# Altium footprint library SparkFun.PCBLIB: 674 footprints (part 16 of 44)
Each footprint in its own frame and in the unit in brackets; x right, y up, seen from the top. Pads: shape width x height; smd on the part's side, far side on the other; paste and mask are expansions set on the pad; w line width, h text height; cw(c..) or ccw(c..) is an arc to the next point about the centre after c.
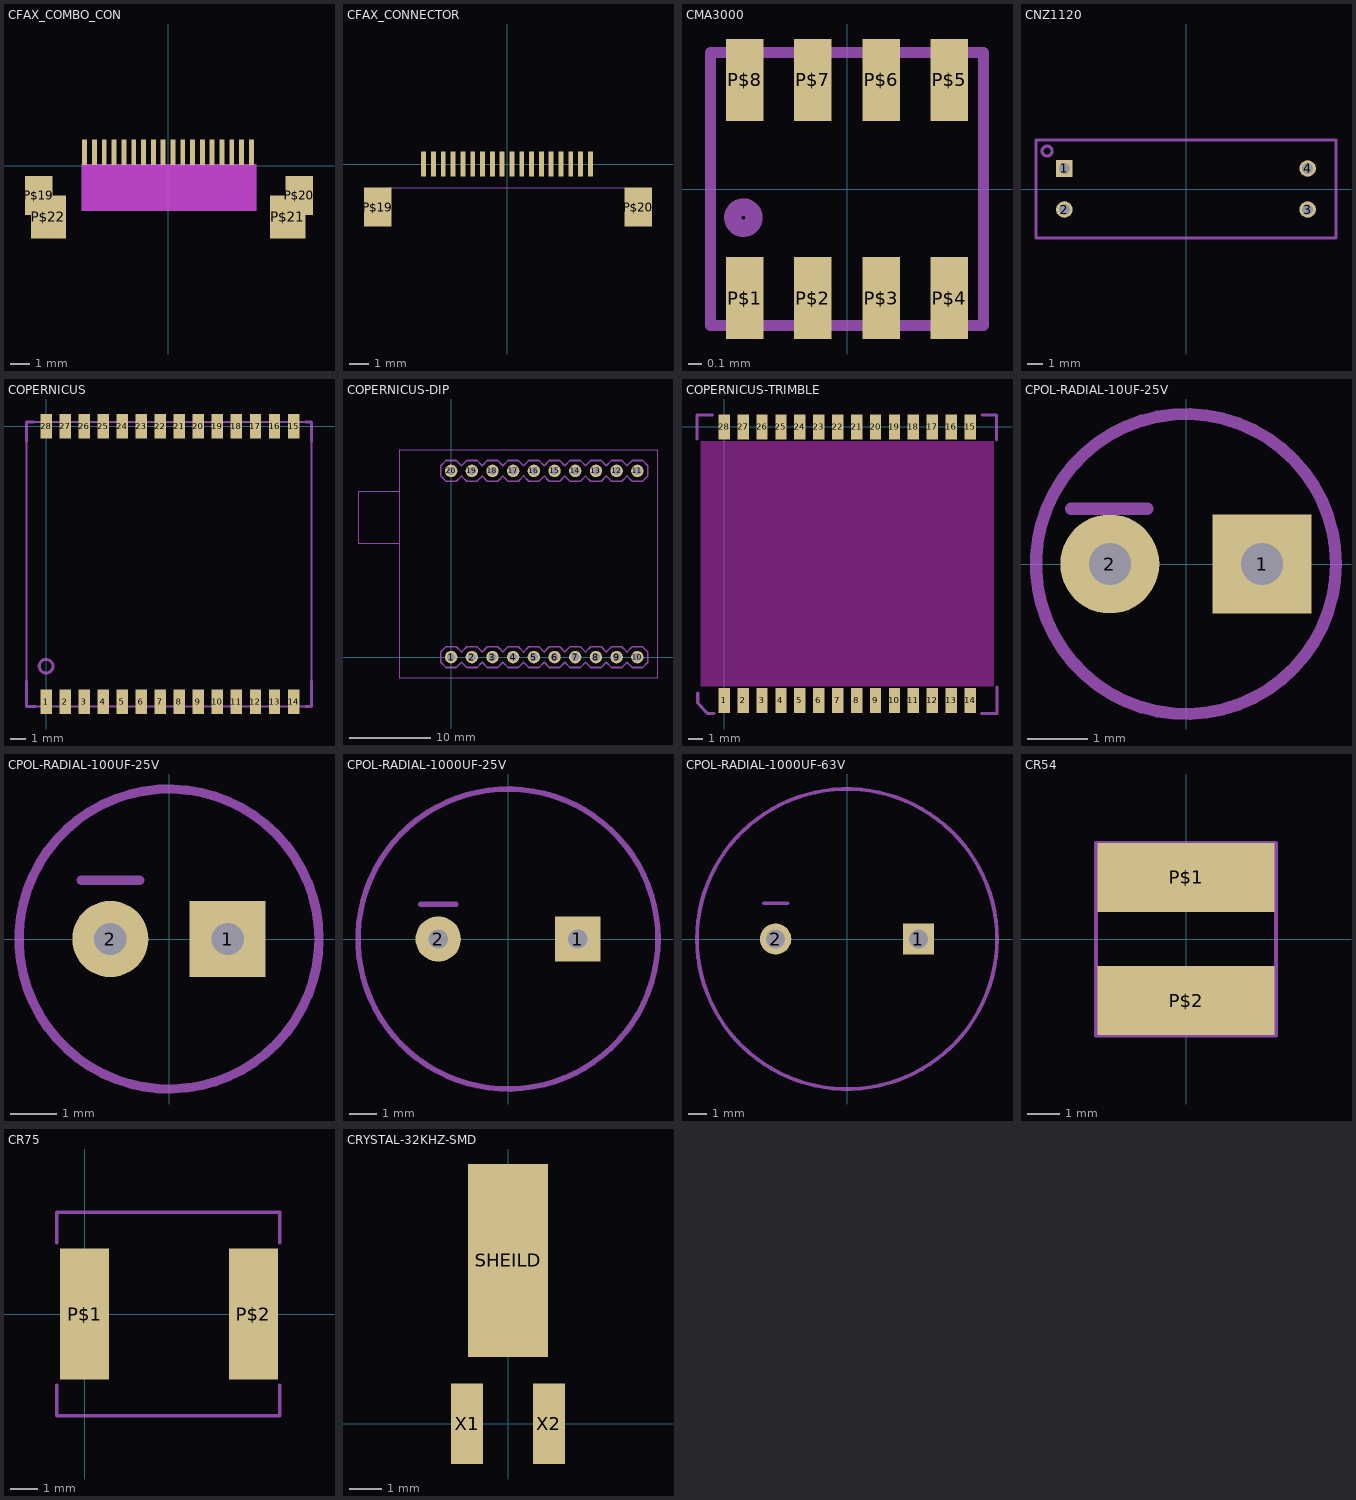
[diagram p15: the footprints below, top view; thin cyan lines are the x and y axes]

## CFAX_COMBO_CON [mm]
pads (22):
  rect 0.25x1.3 smd: P$1(-4.25,0.7) P$2(-3.75,0.7) P$3(-3.25,0.7) P$4(-2.75,0.7) P$5(-2.25,0.7) P$6(-1.75,0.7) P$7(-1.25,0.7) P$8(-0.75,0.7) P$9(-0.25,0.7) P$10(0.25,0.7) P$11(0.75,0.7) P$12(1.25,0.7) P$13(1.75,0.7) P$14(2.25,0.7) P$15(2.75,0.7) P$16(3.25,0.7) P$17(3.75,0.7) P$18(4.25,0.7)
  rect 1.4x2 smd: P$19(-6.6,-1.5) P$20(6.7,-1.5)
  rect 1.8x2.2 smd: P$21(6.1,-2.6) P$22(-6.1,-2.6)
Mechanical 10 keep-out:
  rectangle: -4.4,-2.3 4.5,0.1

## CFAX_CONNECTOR [mm]
pads (20):
  rect 0.25x1.3 smd: P$1(-4.25,0) P$2(-3.75,0) P$3(-3.25,0) P$4(-2.75,0) P$5(-2.25,0) P$6(-1.75,0) P$7(-1.25,0) P$8(-0.75,0) P$9(-0.25,0) P$10(0.25,0) P$11(0.75,0) P$12(1.25,0) P$13(1.75,0) P$14(2.25,0) P$15(2.75,0) P$16(3.25,0) P$17(3.75,0) P$18(4.25,0)
  rect 1.4x2 smd: P$19(-6.6,-2.2) P$20(6.7,-2.2)
Mechanical 2:
  lines w0: -6,-1.2 6,-1.2

## CMA3000 [mil]
pads (8):
  rect 10.83x23.62 smd: P$1(-29.53,-31.5) P$2(-9.84,-31.5) P$3(9.84,-31.5) P$4(29.53,-31.5) P$5(29.53,31.5) P$6(9.84,31.5) P$7(-9.84,31.5) P$8(-29.53,31.5)
Mechanical 2:
  circle w5: c-29.92,-8.27 r3.07
  lines w3.15: -39.37,-39.37 -39.37,39.37 ; 39.37,-39.37 39.37,39.37
Mechanical 18:
  lines w3.15: -39.37,-39.37 39.37,-39.37 ; -39.37,39.37 39.37,39.37

## CMA3000-A01 [mil]

## CNZ1120 [mm]
pads (4):
  rect 1.05x1.05 hole 0.7: 1(-7.7,1.3)
  round 1.05 hole 0.7: 2(-7.7,-1.3) 3(7.7,-1.3) 4(7.7,1.3)
Mechanical 2:
  circle w0.203: c-8.8,2.4 r0.316
  lines w0.203: -9.5,-3.1 9.5,-3.1 9.5,3.1 -9.5,3.1 -9.5,-3.1

## COPERNICUS [mil]
pads (28):
  rect 30x65 smd paste-32.5: 1(0,-723) 2(50,-723) 3(100,-723) 4(150,-723) 5(200,-723) 6(250,-723) 7(300,-723) 8(350,-723) 9(400,-723) 10(450,-723) 11(500,-723) 12(550,-723) 13(600,-723) 14(650,-723) 15(650,0) 16(600,0) 17(550,0) 18(500,0) 19(450,0) 20(400,0) 21(350,0) 22(300,0) 23(250,0) 24(200,0) 25(150,0) 26(100,0) 27(50,0) 28(0,0)
Top Paste:
  region: 0,0 10,0 10,10 0,10
  region: 0,0 10,0 10,10 0,10
  region: 0,0 10,0 10,10 0,10
  region: 0,0 10,0 10,10 0,10
  region: 0,0 10,0 10,10 0,10
  region: 0,0 10,0 10,10 0,10
  region: 0,0 10,0 10,10 0,10
  region: 0,0 10,0 10,10 0,10
  region: 0,0 10,0 10,10 0,10
  region: 0,0 10,0 10,10 0,10
  region: 0,0 10,0 10,10 0,10
  region: 0,0 10,0 10,10 0,10
  region: 0,0 10,0 10,10 0,10
  region: 0,0 10,0 10,10 0,10
  region: 0,0 10,0 10,10 0,10
  region: 0,0 10,0 10,10 0,10
  region: 0,0 10,0 10,10 0,10
  region: 0,0 10,0 10,10 0,10
  region: 0,0 10,0 10,10 0,10
  region: 0,0 10,0 10,10 0,10
  region: 0,0 10,0 10,10 0,10
  region: 0,0 10,0 10,10 0,10
  region: 0,0 10,0 10,10 0,10
  region: 0,0 10,0 10,10 0,10
  region: 0,0 10,0 10,10 0,10
  region: 0,0 10,0 10,10 0,10
  region: 0,0 10,0 10,10 0,10
  region: 0,0 10,0 10,10 0,10
Mechanical 2:
  circle w8: c0,-629.92 r17.99
  lines w8: -51.18,-669.29 -51.18,-736.22 -27.56,-736.22 ; -51.18,-39.37 -51.18,11.81 -31.5,11.81 ; 681.1,-736.22 696.85,-736.22 696.85,-669.29 ; 681.1,11.81 696.85,11.81 696.85,-39.37
Mechanical 18:
  lines w5: -51.18,-736.22 -51.18,11.81 696.85,11.81 696.85,-736.22 -51.18,-736.22

## COPERNICUS-DIP [mil]
pads (20):
  round 60 hole 40: 1(0,0) 2(100,0) 3(200,0) 4(300,0) 5(400,0) 6(500,0) 7(600,0) 8(700,0) 9(800,0) 10(900,0) 11(900,900) 12(800,900) 13(700,900) 14(600,900) 15(500,900) 16(400,900) 17(300,900) 18(200,900) 19(100,900) 20(0,900)
Mechanical 2:
  lines w8: -50,-25 -50,25 -25,50 25,50 50,25 75,50 125,50 150,25 175,50 225,50 250,25 275,50 325,50 350,25 375,50 425,50 450,25 475,50 525,50 550,25 575,50 625,50 650,25 675,50 725,50 750,25 775,50 825,50 850,25 875,50 925,50 950,25 950,-25 925,-50 875,-50 850,-25 825,-50 775,-50 750,-25 725,-50 675,-50 650,-25 625,-50 575,-50 550,-25 525,-50 475,-50 450,-25 425,-50 375,-50 350,-25 325,-50 275,-50 250,-25 225,-50 175,-50 150,-25 125,-50 75,-50 50,-25 25,-50 -25,-50 -50,-25 ; -50,875 -50,925 -25,950 25,950 50,925 75,950 125,950 150,925 175,950 225,950 250,925 275,950 325,950 350,925 375,950 425,950 450,925 475,950 525,950 550,925 575,950 625,950 650,925 675,950 725,950 750,925 775,950 825,950 850,925 875,950 925,950 950,925 950,875 925,850 875,850 850,875 825,850 775,850 750,875 725,850 675,850 650,875 625,850 575,850 550,875 525,850 475,850 450,875 425,850 375,850 350,875 325,850 275,850 250,875 225,850 175,850 150,875 125,850 75,850 50,875 25,850 -25,850 -50,875
Mechanical 18:
  rectangle: 590,-10 610,10
  rectangle: 490,-10 510,10
  rectangle: 390,-10 410,10
  rectangle: 290,-10 310,10
  rectangle: 190,-10 210,10
  rectangle: 90,-10 110,10
  rectangle: -10,-10 10,10
  rectangle: 890,-10 910,10
  rectangle: 790,-10 810,10
  rectangle: 690,-10 710,10
  rectangle: 590,890 610,910
  rectangle: 490,890 510,910
  rectangle: 390,890 410,910
  rectangle: 290,890 310,910
  rectangle: 190,890 210,910
  rectangle: 90,890 110,910
  rectangle: -10,890 10,910
  rectangle: 890,890 910,910
  rectangle: 790,890 810,910
  rectangle: 690,890 710,910
  lines w5: -250,550 -250,800 ; -250,550 -250,-100 1000,-100 1000,1000 -250,1000 -250,800 ; -250,550 -450,550 -450,800 -250,800

## COPERNICUS-TRIMBLE [mil]
pads (28):
  rect 30x65 smd paste-32.5: 1(0,-723) 2(50,-723) 3(100,-723) 4(150,-723) 5(200,-723) 6(250,-723) 7(300,-723) 8(350,-723) 9(400,-723) 10(450,-723) 11(500,-723) 12(550,-723) 13(600,-723) 14(650,-723) 15(650,0) 16(600,0) 17(550,0) 18(500,0) 19(450,0) 20(400,0) 21(350,0) 22(300,0) 23(250,0) 24(200,0) 25(150,0) 26(100,0) 27(50,0) 28(0,0)
Top Paste:
  region: 0,0 10,0 10,10 0,10
  region: 0,0 10,0 10,10 0,10
  region: 0,0 10,0 10,10 0,10
  region: 0,0 10,0 10,10 0,10
  region: 0,0 10,0 10,10 0,10
  region: 0,0 10,0 10,10 0,10
  region: 0,0 10,0 10,10 0,10
  region: 0,0 10,0 10,10 0,10
  region: 0,0 10,0 10,10 0,10
  region: 0,0 10,0 10,10 0,10
  region: 0,0 10,0 10,10 0,10
  region: 0,0 10,0 10,10 0,10
  region: 0,0 10,0 10,10 0,10
  region: 0,0 10,0 10,10 0,10
  region: 0,0 10,0 10,10 0,10
  region: 0,0 10,0 10,10 0,10
  region: 0,0 10,0 10,10 0,10
  region: 0,0 10,0 10,10 0,10
  region: 0,0 10,0 10,10 0,10
  region: 0,0 10,0 10,10 0,10
  region: 0,0 10,0 10,10 0,10
  region: 0,0 10,0 10,10 0,10
  region: 0,0 10,0 10,10 0,10
  region: 0,0 10,0 10,10 0,10
  region: 0,0 10,0 10,10 0,10
  region: 0,0 10,0 10,10 0,10
  region: 0,0 10,0 10,10 0,10
  region: 0,0 10,0 10,10 0,10
Top Solder:
  region: -63,25 -63,-749 713,-749 713,25
Keep-Out Layer:
  rectangle: -63,-686 713,-37
Mechanical 2:
  lines w8: -72,-32 -72,32 -31,32 ; -70,-703 -70,-730 -45,-757 -27,-757 ; 680,-757 721,-757 721,-687 ; 681,31 720,31 720,-34

## CPOL-RADIAL-10UF-25V [mil]
pads (2):
  rect 65x65 hole 27.56: 1(50,0)
  round 65 hole 27.56: 2(-50,0)
Mechanical 2:
  circle w8: c0,0 r98.43
  lines w8: -75.39,36.22 -25.39,36.22

## CPOL-RADIAL-100UF-25V [mil]
pads (2):
  rect 65x65 hole 27.56: 1(50,0)
  round 65 hole 27.56: 2(-50,0)
Mechanical 2:
  circle w8: c0,0 r127.95
  lines w8: -75,50 -25,50

## CPOL-RADIAL-1000UF-25V [mil]
pads (2):
  rect 65x65 hole 27.56: 1(100,0)
  round 65 hole 27.56: 2(-100,0)
Mechanical 2:
  circle w8: c0,0 r215
  lines w8: -125,50 -75,50

## CPOL-RADIAL-1000UF-63V [mil]
pads (2):
  rect 65x65 hole 40: 1(150,0)
  round 66 hole 40: 2(-150,0)
Mechanical 2:
  circle w8: c0,0 r315
  lines w8: -175,75 -125,75

## CR54 [mm]
pads (2):
  rect 5.5x2.15 smd: P$1(0,1.92) P$2(0,-1.92)
Mechanical 18:
  lines w0.127: -2.8,-3 -2.8,2.98 2.8,2.98 2.8,-3 -2.8,-3

## CR75 [mm]
pads (2):
  rect 1.75x4.7 smd: P$1(0,0) P$2(6.05,0)
Mechanical 2:
  lines w0.127: -1,-2.55 -1,-3.65 7,-3.65 7,-2.55 ; -1,2.55 -1,3.65 7,3.65 7,2.55

## CREATIVE_COMMONS [mil]

## CRYSTAL-32KHZ-SMD [mm]
pads (3):
  rect 2.5x6 smd: SHEILD(0,5.08)
  rect 1x2.5 smd: X1(-1.27,0) X2(1.27,0)